# Altium footprint library Relays.PcbLib: 113 footprints (part 3 of 8)
Each footprint in its own frame and in the unit in brackets; x right, y up, seen from the top. Pads: shape width x height; smd on the part's side, far side on the other; paste and mask are expansions set on the pad; w line width, h text height; cw(c..) or ccw(c..) is an arc to the next point about the centre after c.
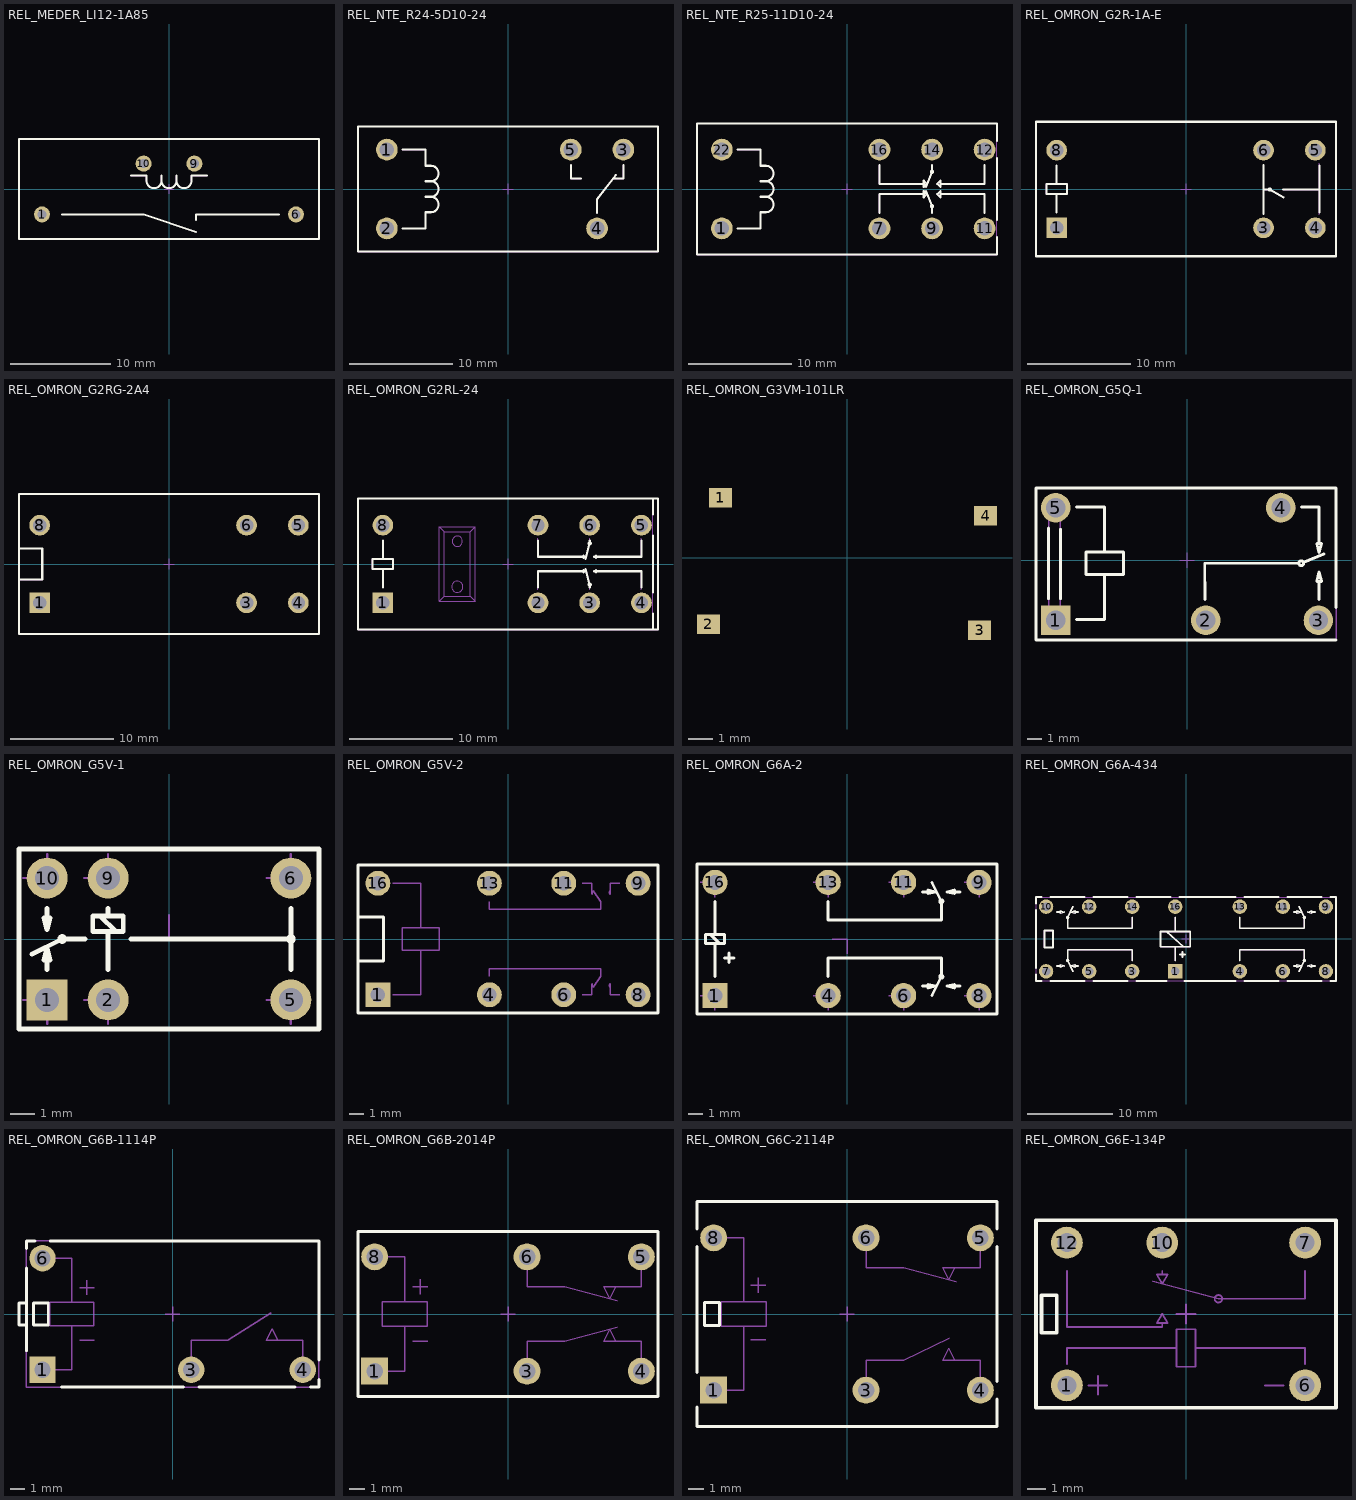
[diagram p2: the footprints below, top view; thin cyan lines are the x and y axes]

## REL_MEDER_LI12-1A85 [mm] "1 Form A, High Voltage, High Dielectric Strength, High Insulation Resistance, MEDER LI Series, Body 30 x 10 x 10.4mm"
height 10.4
pads (4):
  round 1.6 hole 0.9: 1(-12.7,-2.54) 6(12.7,-2.54) 9(2.54,2.54) 10(-2.54,2.54)
Top Overlay:
  lines w0.2: -10.7,-2.54 -2.5,-2.54 2.7,-4.28 ; -3.81,1.328 -2.25,1.328 -2.25,0.828 ccw(c-1.5,0.828) -0.75,0.828 ; -0.75,1.328 -0.75,0.828 ; 0.75,1.328 0.75,0.828 ; 2.696,-3.08 2.696,-2.54 11,-2.54 ; 3.81,1.328 2.25,1.328 2.25,0.828 cw(c1.5,0.828) 0.75,0.828 ; -0.75,0.828 ccw(c0,0.828) 0.75,0.828 ; -15,-5 -15,5 15,5 15,-5 -15,-5
Mechanical 8:
  lines w0.05: -13.2,-2.54 -12.7,-2.54 ; -12.7,-3.04 -12.7,-2.54 ; -12.7,-2.04 -12.7,-2.54 ; -12.2,-2.54 -12.7,-2.54 ; -3.04,2.54 -2.54,2.54 ; -2.54,2.04 -2.54,2.54 ; -2.54,3.04 -2.54,2.54 ; -2.04,2.54 -2.54,2.54 ; -0.5,0 0,0 ; 0,-0.5 0,0 ; 0,0.5 0,0 ; 0.5,0 0,0 ; 2.04,2.54 2.54,2.54 ; 2.54,2.04 2.54,2.54 ; 2.54,3.04 2.54,2.54 ; 3.04,2.54 2.54,2.54 ; 12.2,-2.54 12.7,-2.54 ; 12.7,-3.04 12.7,-2.54 ; 12.7,-2.04 12.7,-2.54 ; 13.2,-2.54 12.7,-2.54
Mechanical 14:
  lines w0.1: -10.7,-2.54 -2.5,-2.54 2.7,-4.28 ; -3.81,1.328 -2.25,1.328 -2.25,0.828 ccw(c-1.5,0.828) -0.75,0.828 ; -0.75,1.328 -0.75,0.828 ; 0.75,1.328 0.75,0.828 ; 2.696,-3.08 2.696,-2.54 11,-2.54 ; 3.81,1.328 2.25,1.328 2.25,0.828 cw(c1.5,0.828) 0.75,0.828 ; -0.75,0.828 ccw(c0,0.828) 0.75,0.828 ; -15,-5 -15,5 15,5 15,-5 -15,-5
3D body "REL_MEDER_LI12-1A85.stp": height 10.4, standoff -3, extent -15,-5 15,5

## REL_NTE_R24-5D10-24 [mm] "SPDT PCB Relay, R24 Series"
height 26.2
pads (5):
  round 2.1 hole 1.4: 1(-11.71,3.81) 2(-11.71,-3.81) 3(11.15,3.81) 4(8.61,-3.81) 5(6.07,3.81)
Top Overlay:
  lines w0.2: -10.21,-3.81 -7.958,-3.81 -7.958,-2.25 -7.458,-2.25 ccw(c-7.458,-1.5) -7.458,-0.75 ; -10.21,3.81 -7.958,3.81 -7.958,2.25 -7.458,2.25 cw(c-7.458,1.5) -7.458,0.75 ; -7.958,-0.75 -7.458,-0.75 ; -7.958,0.75 -7.458,0.75 ; 6.07,2.31 6.07,1 7.07,1 ; 8.61,-2.31 8.61,-1 10.413,1.342 ; 10.15,1 11.15,1 11.15,2.31 ; -7.458,-0.75 ccw(c-7.458,0) -7.458,0.75 ; -14.5,-6.05 -14.5,6.05 14.5,6.05 14.5,-6.05 -14.5,-6.05
Mechanical 8:
  lines w0.1: -12.21,-3.81 -11.71,-3.81 ; -12.21,3.81 -11.71,3.81 ; -11.71,-4.31 -11.71,-3.81 ; -11.71,-3.31 -11.71,-3.81 ; -11.71,3.31 -11.71,3.81 ; -11.71,4.31 -11.71,3.81 ; -11.21,-3.81 -11.71,-3.81 ; -11.21,3.81 -11.71,3.81 ; -0.5,0 0,0 ; 0,-0.5 0,0 ; 0,0.5 0,0 ; 0.5,0 0,0 ; 5.57,3.81 6.07,3.81 ; 6.07,3.31 6.07,3.81 ; 6.07,4.31 6.07,3.81 ; 6.57,3.81 6.07,3.81 ; 8.11,-3.81 8.61,-3.81 ; 8.61,-4.31 8.61,-3.81 ; 8.61,-3.31 8.61,-3.81 ; 9.11,-3.81 8.61,-3.81 ; 10.65,3.81 11.15,3.81 ; 11.15,3.31 11.15,3.81 ; 11.15,4.31 11.15,3.81 ; 11.65,3.81 11.15,3.81
Mechanical 14:
  lines w0.1: -10.21,-3.81 -7.958,-3.81 -7.958,-2.25 -7.458,-2.25 ccw(c-7.458,-1.5) -7.458,-0.75 ; -10.21,3.81 -7.958,3.81 -7.958,2.25 -7.458,2.25 cw(c-7.458,1.5) -7.458,0.75 ; -7.958,-0.75 -7.458,-0.75 ; -7.958,0.75 -7.458,0.75 ; 6.07,2.31 6.07,1 7.07,1 ; 8.61,-2.31 8.61,-1 10.413,1.342 ; 10.15,1 11.15,1 11.15,2.31 ; -7.458,-0.75 ccw(c-7.458,0) -7.458,0.75 ; -14.5,-6.05 -14.5,6.05 14.5,6.05 14.5,-6.05 -14.5,-6.05
3D body "REL_NTE_R24-5D10-24.stp": height 26.2, standoff -3.8, extent -14.5,-6.05 14.5,6.05

## REL_NTE_R25-11D10-24 [mm] "DPDT PCB Relay, R25 Series"
height 25.5
pads (8):
  round 2.1 hole 1.4: 1(-12.1,-3.81) 7(3.14,-3.81) 9(8.22,-3.81) 11(13.3,-3.81) 12(13.3,3.81) 14(8.22,3.81) 16(3.14,3.81) 22(-12.1,3.81)
Top Overlay:
  circle w0.2: c8.22,-1.655 r0.1
  circle w0.2: c8.22,1.655 r0.1
  lines w0.2: -10.6,-3.81 -8.348,-3.81 -8.348,-2.25 -7.848,-2.25 ccw(c-7.848,-1.5) -7.848,-0.75 ; -10.6,3.81 -8.348,3.81 -8.348,2.25 -7.848,2.25 cw(c-7.848,1.5) -7.848,0.75 ; -8.348,-0.75 -7.848,-0.75 ; -8.348,0.75 -7.848,0.75 ; 3.14,-2.31 3.14,-0.5 7.42,-0.5 ; 3.14,2.31 3.14,0.5 7.42,0.5 ; 7.633,-0.2 8.22,-1.655 8.22,-2.31 ; 7.633,0.2 8.22,1.655 8.22,2.31 ; 9.02,-0.5 13.3,-0.5 13.3,-2.31 ; 9.02,0.5 13.3,0.5 13.3,2.31 ; 14.5,-4.65 14.5,-6.35 -14.5,-6.35 -14.5,6.35 14.5,6.35 14.5,4.65 ; 14.5,-3 14.5,3 ; -7.848,-0.75 ccw(c-7.848,0) -7.848,0.75 ; 7.42,-0.8 7.42,-0.2 7.72,-0.5 7.42,-0.8 ; 7.42,0.2 7.42,0.8 7.72,0.5 7.42,0.2 ; 8.72,-0.5 9.02,-0.2 9.02,-0.8 8.72,-0.5 ; 8.72,0.5 9.02,0.2 9.02,0.8 8.72,0.5
Mechanical 8:
  lines w0.1: -12.6,-3.81 -12.1,-3.81 ; -12.6,3.81 -12.1,3.81 ; -12.1,-4.31 -12.1,-3.81 ; -12.1,-3.31 -12.1,-3.81 ; -12.1,3.31 -12.1,3.81 ; -12.1,4.31 -12.1,3.81 ; -11.6,-3.81 -12.1,-3.81 ; -11.6,3.81 -12.1,3.81 ; -0.5,0 0,0 ; 0,-0.5 0,0 ; 0,0.5 0,0 ; 0.5,0 0,0 ; 2.64,3.81 3.14,3.81 ; 3.14,3.31 3.14,3.81 ; 3.14,4.31 3.14,3.81 ; 3.64,3.81 3.14,3.81 ; 7.72,3.81 8.22,3.81 ; 8.22,3.31 8.22,3.81 ; 8.22,4.31 8.22,3.81 ; 8.72,3.81 8.22,3.81 ; 12.8,-3.81 13.3,-3.81 ; 12.8,3.81 13.3,3.81 ; 13.3,-4.31 13.3,-3.81 ; 13.3,-3.31 13.3,-3.81 ; 13.3,3.31 13.3,3.81 ; 13.3,4.31 13.3,3.81 ; 13.8,-3.81 13.3,-3.81 ; 13.8,3.81 13.3,3.81 ; 2.64,-3.81 3.14,-3.81 ; 2.64,-3.81 3.14,-3.81 ; 2.64,-3.81 3.14,-3.81 ; 3.14,-4.31 3.14,-3.81 ; 3.14,-4.31 3.14,-3.81 ; 3.14,-4.31 3.14,-3.81 ; 3.14,-3.81 3.64,-3.81 ; 3.14,-3.81 3.14,-3.31 ; 3.14,-3.81 3.64,-3.81 ; 3.14,-3.81 3.14,-3.31 ; 3.14,-3.81 3.64,-3.81 ; 3.14,-3.81 3.14,-3.31 ; 7.72,-3.81 8.22,-3.81 ; 7.72,-3.81 8.22,-3.81 ; 7.72,-3.81 8.22,-3.81 ; 7.72,-3.81 8.22,-3.81 ; 8.22,-4.31 8.22,-3.81 ; 8.22,-4.31 8.22,-3.81 ; 8.22,-4.31 8.22,-3.81 ; 8.22,-4.31 8.22,-3.81 ; 8.22,-3.81 8.72,-3.81 ; 8.22,-3.81 8.22,-3.31 ; 8.22,-3.81 8.72,-3.81 ; 8.22,-3.81 8.22,-3.31 ; 8.22,-3.81 8.72,-3.81 ; 8.22,-3.81 8.22,-3.31 ; 8.22,-3.81 8.72,-3.81 ; 8.22,-3.81 8.22,-3.31
Mechanical 14:
  circle w0.1: c8.22,-1.655 r0.1
  circle w0.1: c8.22,1.655 r0.1
  lines w0.1: -10.6,-3.81 -8.348,-3.81 -8.348,-2.25 -7.848,-2.25 ccw(c-7.848,-1.5) -7.848,-0.75 ; -10.6,3.81 -8.348,3.81 -8.348,2.25 -7.848,2.25 cw(c-7.848,1.5) -7.848,0.75 ; -8.348,-0.75 -7.848,-0.75 ; -8.348,0.75 -7.848,0.75 ; 3.14,-2.31 3.14,-0.5 7.42,-0.5 ; 3.14,2.31 3.14,0.5 7.42,0.5 ; 7.633,-0.2 8.22,-1.655 8.22,-2.31 ; 7.633,0.2 8.22,1.655 8.22,2.31 ; 9.02,-0.5 13.3,-0.5 13.3,-2.31 ; 9.02,0.5 13.3,0.5 13.3,2.31 ; -7.848,-0.75 ccw(c-7.848,0) -7.848,0.75 ; -14.5,-6.35 14.5,-6.35 14.5,6.35 -14.5,6.35 -14.5,-6.35 ; 7.42,-0.8 7.42,-0.2 7.72,-0.5 7.42,-0.8 ; 7.42,0.2 7.42,0.8 7.72,0.5 7.42,0.2 ; 8.72,-0.5 9.02,-0.2 9.02,-0.8 8.72,-0.5 ; 8.72,0.5 9.02,0.2 9.02,0.8 8.72,0.5
3D body "REL_NTE_R25-11D10-24.stp": height 25.5, standoff -3.8, extent -14.5,-6.35 14.5,6.35

## REL_OMRON_G2R-1A-E [mm] "6 Leads, Row Spacing 7.5 mm; Body 29mm x 13mm, OMRON_G2R-1A-E Series"
height 25.5
pads (6):
  rect 2x2 hole 1.3: 1(-12.5,-3.75)
  round 2 hole 1.3: 3(7.5,-3.75) 4(12.5,-3.75) 5(12.5,3.75) 6(7.5,3.75) 8(-12.5,3.75)
Top Overlay:
  circle w0.2: c8.1,-0.05 r0.1
  lines w0.2: -12.5,-2.25 -12.5,-0.5 ; -12.5,0.5 -12.5,2.25 ; 7.5,-2.4 7.5,2.3 ; 7.5,-0.05 8.1,-0.05 9.444,-0.828 ; 9.4,-0.05 12.8,-0.05 ; 12.9,-2.25 12.9,2.25 ; -14.5,-6.5 14.5,-6.5 14.5,6.5 -14.5,6.5 -14.5,-6.5 ; -13.5,-0.5 -11.5,-0.5 -11.5,0.5 -13.5,0.5 -13.5,-0.5
Mechanical 8:
  lines w0.05: -13,-3.75 -12.5,-3.75 ; -13,3.75 -12.5,3.75 ; -12.5,-4.25 -12.5,-3.75 ; -12.5,-3.25 -12.5,-3.75 ; -12.5,3.25 -12.5,3.75 ; -12.5,4.25 -12.5,3.75 ; -12,-3.75 -12.5,-3.75 ; -12,3.75 -12.5,3.75 ; -0.5,0 0,0 ; 0,-0.5 0,0 ; 0,0.5 0,0 ; 0.5,0 0,0 ; 7,-3.75 7.5,-3.75 ; 7,3.75 7.5,3.75 ; 7.5,-4.25 7.5,-3.75 ; 7.5,-3.25 7.5,-3.75 ; 7.5,3.25 7.5,3.75 ; 7.5,4.25 7.5,3.75 ; 8,-3.75 7.5,-3.75 ; 8,3.75 7.5,3.75 ; 12,-3.75 12.5,-3.75 ; 12,3.75 12.5,3.75 ; 12.5,-4.25 12.5,-3.75 ; 12.5,-3.25 12.5,-3.75 ; 12.5,3.25 12.5,3.75 ; 12.5,4.25 12.5,3.75 ; 13,-3.75 12.5,-3.75 ; 13,3.75 12.5,3.75
Mechanical 14:
  lines w0.1: -12.5,-2.25 -12.5,-0.5 ; -12.5,0.5 -12.5,2.25 ; 7.5,-2.4 7.5,2.3 ; 7.5,-0.05 8.1,-0.05 9.444,-0.828 ; 9.4,-0.05 12.8,-0.05 ; 12.9,-2.5 12.9,2.5 ; -14.5,-6.5 14.5,-6.5 14.5,6.5 -14.5,6.5 -14.5,-6.5 ; -13.5,-0.5 -11.5,-0.5 -11.5,0.5 -13.5,0.5 -13.5,-0.5
3D body "REL_OMRON_G2R-1A-E.stp": height 25.5, standoff -4, extent -14.5,-6.5 14.5,6.5

## REL_OMRON_G2RG-2A4 [mm] "6 Leads, Row Spacing 7.5 mm; Body 29mm x 13.5mm, OMRON_G2RG Series"
height 25.5
pads (6):
  rect 2x2 hole 1.3: 1(-12.5,-3.75)
  round 2 hole 1.3: 3(7.5,-3.75) 4(12.5,-3.75) 5(12.5,3.75) 6(7.5,3.75) 8(-12.5,3.75)
Top Overlay:
  lines w0.2: -14.5,-1.5 -12.25,-1.5 -12.25,1.5 -14.5,1.5 ; -14.5,-6.75 14.5,-6.75 14.5,6.75 -14.5,6.75 -14.5,-6.75
Mechanical 8:
  lines w0.1: -13,-3.75 -12.5,-3.75 ; -13,3.75 -12.5,3.75 ; -12.5,-4.25 -12.5,-3.75 ; -12.5,-3.25 -12.5,-3.75 ; -12.5,3.25 -12.5,3.75 ; -12.5,4.25 -12.5,3.75 ; -12,-3.75 -12.5,-3.75 ; -12,3.75 -12.5,3.75 ; -0.5,0 0,0 ; 0,-0.5 0,0 ; 0,0.5 0,0 ; 0.5,0 0,0 ; 7,-3.75 7.5,-3.75 ; 7,3.75 7.5,3.75 ; 7.5,-4.25 7.5,-3.75 ; 7.5,-3.25 7.5,-3.75 ; 7.5,3.25 7.5,3.75 ; 7.5,4.25 7.5,3.75 ; 8,-3.75 7.5,-3.75 ; 8,3.75 7.5,3.75 ; 12,-3.75 12.5,-3.75 ; 12,3.75 12.5,3.75 ; 12.5,-4.25 12.5,-3.75 ; 12.5,-3.25 12.5,-3.75 ; 12.5,3.25 12.5,3.75 ; 12.5,4.25 12.5,3.75 ; 13,-3.75 12.5,-3.75 ; 13,3.75 12.5,3.75
Mechanical 14:
  lines w0.1: -14.5,-1.5 -12.25,-1.5 -12.25,1.5 -14.5,1.5 ; -14.5,-6.75 14.5,-6.75 14.5,6.75 -14.5,6.75 -14.5,-6.75
3D body "REL_OMRON_G2RG-2A4.stp": height 25.5, standoff -3.6, extent -14.5,-6.75 14.5,6.75

## REL_OMRON_G2RL-24 [mm] "8 Leads, Row Spacing 7.5 mm; Body 29mm x 12.7mm, OMRON_G2RL Series"
height 15.7
pads (8):
  rect 2x2 hole 1.3: 1(-12.1,-3.75)
  round 2 hole 1.3: 2(2.9,-3.75) 3(7.9,-3.75) 4(12.9,-3.75) 5(12.9,3.75) 6(7.9,3.75) 7(2.9,3.75) 8(-12.1,3.75)
Top Overlay:
  circle w0.2: c7.9,-2 r0.1
  circle w0.2: c7.9,2 r0.1
  lines w0.2: -12.1,-2.25 -12.1,-0.5 ; -12.1,0.5 -12.1,2.25 ; 2.9,-2.25 2.9,-0.7 7.3,-0.7 ; 2.9,2.25 2.9,0.7 7.3,0.7 ; 7.5,-0.5 7.9,-2 7.9,-2.25 ; 7.5,0.5 7.9,2 7.9,2.25 ; 8.5,-0.7 12.9,-0.7 12.9,-2.25 ; 8.5,0.7 12.9,0.7 12.9,2.25 ; 14,-6.35 14,-4.77 ; 14,-2.73 14,2.73 ; 14,4.77 14,6.35 ; -14.5,-6.35 14.5,-6.35 14.5,6.35 -14.5,6.35 -14.5,-6.35 ; -13.1,-0.5 -11.1,-0.5 -11.1,0.5 -13.1,0.5 -13.1,-0.5 ; 7.3,-0.8 7.3,-0.6 7.5,-0.7 7.3,-0.8 ; 7.3,0.6 7.3,0.8 7.5,0.7 7.3,0.6 ; 8.3,-0.7 8.5,-0.6 8.5,-0.8 8.3,-0.7 ; 8.3,0.7 8.5,0.6 8.5,0.8 8.3,0.7
Mechanical 8:
  lines w0.1: -12.6,-3.75 -12.1,-3.75 -12.1,-4.25 ; -12.6,3.75 -12.1,3.75 -12.1,3.25 ; -0.5,0 0,0 ; 0,-0.5 0,0 ; 0,0.5 0,0 ; 0.5,0 0,0 ; 2.4,-3.75 2.9,-3.75 2.9,-4.25 ; 2.4,3.75 2.9,3.75 2.9,3.25 ; 7.4,-3.75 7.9,-3.75 7.9,-4.25 ; 7.4,3.75 7.9,3.75 7.9,3.25 ; 12.4,-3.75 12.9,-3.75 12.9,-4.25 ; 12.4,3.75 12.9,3.75 12.9,3.25
Mechanical 14:
  circle w0.1: c-4.9,2.2 r0.5
  circle w0.1: c-4.9,-2.2 r0.54
  circle w0.1: c7.9,-2 r0.05
  circle w0.1: c7.9,2 r0.05
  lines w0.1: -12.1,-2.25 -12.1,-0.5 ; -12.1,0.5 -12.1,2.25 ; 2.9,-2.5 2.9,-0.7 7.3,-0.7 ; 2.9,2.5 2.9,0.7 7.3,0.7 ; 7.5,-0.5 7.9,-2 7.9,-2.5 ; 7.5,0.5 7.9,2 7.9,2.5 ; 8.5,-0.7 12.9,-0.7 12.9,-2.5 ; 8.5,0.7 12.9,0.7 12.9,2.5 ; 14,-6.35 14,6.35 ; -6.65,-3.6 -3.15,-3.6 ; -6.65,-3.6 -6.65,3.6 ; -6.65,-3.6 -6.15,-3.1 ; -6.65,3.6 -3.15,3.6 ; -6.65,3.6 -6.15,3.1 ; -6.15,-3.1 -3.65,-3.1 ; -6.15,-3.1 -6.15,3.1 ; -6.15,3.1 -3.65,3.1 ; -3.65,-3.1 -3.15,-3.6 ; -3.65,-3.1 -3.65,3.1 ; -3.65,3.1 -3.15,3.6 ; -3.15,-3.6 -3.15,3.6 ; -14.5,-6.35 14.5,-6.35 14.5,6.35 -14.5,6.35 -14.5,-6.35 ; -13.1,-0.5 -11.1,-0.5 -11.1,0.5 -13.1,0.5 -13.1,-0.5 ; 7.3,-0.8 7.3,-0.6 7.5,-0.7 7.3,-0.8 ; 7.3,0.6 7.3,0.8 7.5,0.7 7.3,0.6 ; 8.3,-0.7 8.5,-0.6 8.5,-0.8 8.3,-0.7 ; 8.3,0.7 8.5,0.6 8.5,0.8 8.3,0.7
3D body "REL_OMRON_G2RL-24.stp": height 15.7, standoff -3.5, extent -14.5,-6.35 14.5,6.35

## REL_OMRON_G3VM-101LR [mm] "SMD MOS FET Relay in SSOP Package, Body 3.8mm x 2.04mm"
height 1.8
pads (4):
  rect 0.95x0.8 smd: 1(-5.25,2.5) 2(-5.75,-2.75) 3(5.5,-3) 4(5.75,1.75)

## REL_OMRON_G5Q-1 [mm] "5 Leads, Row Spacing 7.62 mm; Body 20.3mm x 10.3mm OMRON_G5Q-1 Series"
height 15.8
pads (5):
  rect 2x2 hole 1.3: 1(-8.89,-4.06)
  round 2 hole 1.3: 2(1.27,-4.06) 3(8.89,-4.06) 4(6.35,3.56) 5(-8.89,3.56)
Top Overlay:
  circle w0.2: c7.725,-0.2 r0.159
  lines w0.2: -9.37,-2.6 -9.37,2.2 ; -8.57,-2.6 -8.57,2.1 ; -7.475,-4.01 -5.57,-4.01 -5.57,-0.962 ; -7.475,3.61 -5.57,3.61 -5.57,0.562 ; 1.22,-2.65 1.2,-0.2 7.566,-0.2 ; 7.76,3.61 8.94,3.61 8.94,1.15 ; 7.872,-0.139 9.265,0.435 ; 8.94,-2.663 8.94,-1.433 ; 10.08,-5.4 -10.22,-5.4 -10.22,4.9 10.08,4.9 10.08,-3.2 ; -6.84,-0.962 -6.84,0.562 -4.3,0.562 -4.3,-0.962 -6.84,-0.962 ; 8.781,-1.42 9.099,-1.42 8.94,-0.785 8.781,-1.42 ; 8.781,1.15 8.94,0.515 9.099,1.15 8.781,1.15
Mechanical 8:
  lines w0.05: -9.39,-4.06 -8.89,-4.06 ; -9.39,3.56 -8.89,3.56 ; -8.89,-4.56 -8.89,-4.06 ; -8.89,-3.56 -8.89,-4.06 ; -8.89,3.06 -8.89,3.56 ; -8.89,4.06 -8.89,3.56 ; -8.39,-4.06 -8.89,-4.06 ; -8.39,3.56 -8.89,3.56 ; -0.5,0 0,0 ; 0,-0.5 0,0 ; 0,0.5 0,0 ; 0.5,0 0,0 ; 0.77,-4.06 1.27,-4.06 ; 1.27,-4.56 1.27,-4.06 ; 1.27,-3.56 1.27,-4.06 ; 1.77,-4.06 1.27,-4.06 ; 5.35,3.56 6.35,3.56 ; 5.85,3.56 6.35,3.56 ; 6.35,2.56 6.35,3.56 ; 6.35,3.06 6.35,3.56 ; 6.35,4.06 6.35,3.56 ; 6.35,4.56 6.35,3.56 ; 6.85,3.56 6.35,3.56 ; 7.35,3.56 6.35,3.56 ; 8.39,-4.06 8.89,-4.06 ; 8.89,-4.56 8.89,-4.06 ; 8.89,-3.56 8.89,-4.06 ; 9.39,-4.06 8.89,-4.06
Mechanical 14:
  lines w0.1: -7.475,-4.01 -5.57,-4.01 -5.57,-0.962 ; -7.475,3.61 -5.57,3.61 -5.57,0.562 ; -10.22,-5.4 10.08,-5.4 10.08,4.9 -10.22,4.9 -10.22,-5.4 ; -9.37,-3.75 -9.37,3.25 -8.57,3.25 -8.57,-3.75 -9.37,-3.75 ; -6.84,-0.962 -6.84,0.562 -4.3,0.562 -4.3,-0.962 -6.84,-0.962
3D body "REL_OMRON_G5Q-1.stp": height 16.2, standoff -3.4, extent -10.22,-5.4 10.08,4.9

## REL_OMRON_G5V-1 [mm] "6 Leads, Row Spacing 5.08mm; Body 12.5mm x 7.5mm, OMRON_G5V-1 Series"
height 10
pads (6):
  rect 1.7x1.7 hole 1: 1(-5.08,-2.54)
  round 1.7 hole 1: 2(-2.54,-2.54) 5(5.08,-2.54) 6(5.08,2.54) 9(-2.54,2.54) 10(-5.08,2.54)
Top Overlay:
  circle w0.2: c-4.445,0 r0.1
  circle w0.2: c5.08,0 r0.1
  lines w0.2: -5.715,-0.635 -4.445,0 -3.492,0 ; -5.08,-1.27 -5.08,-0.885 ; -5.08,0.885 -5.08,1.27 ; -2.858,0.953 -2.222,0.318 ; -2.54,-1.27 -2.54,0.318 ; -2.54,0.953 -2.54,1.27 ; -1.587,0 5.08,0 ; 5.08,-1.27 5.08,1.27 ; -6.25,-3.75 6.25,-3.75 6.25,3.75 -6.25,3.75 -6.25,-3.75 ; -5.205,-0.885 -4.955,-0.885 -5.08,-0.385 -5.205,-0.885 ; -5.205,0.885 -4.955,0.885 -5.08,0.385 -5.205,0.885 ; -3.175,0.318 -3.175,0.953 -1.905,0.953 -1.905,0.318 -3.175,0.318
Mechanical 8:
  lines w0.1: -6.08,-2.54 -5.08,-2.54 -5.08,-3.54 ; -6.08,2.54 -5.08,2.54 -5.08,3.54 ; -3.54,-2.54 -2.54,-2.54 -2.54,-3.54 ; -3.54,2.54 -2.54,2.54 -2.54,3.54 ; -1,0 0,0 0,1 ; 4.08,-2.54 5.08,-2.54 5.08,-3.54 ; 4.08,2.54 5.08,2.54 5.08,3.54
Mechanical 14:
  circle w0.1: c5.08,0 r0.1
  circle w0.1: c-4.445,0 r0.1
  lines w0.1: -5.715,-0.635 -4.445,0 -3.492,0 ; -5.08,-1.27 -5.08,-0.885 ; -5.08,0.885 -5.08,1.27 ; -2.858,0.953 -2.222,0.318 ; -2.54,-1.27 -2.54,0.318 ; -2.54,0.953 -2.54,1.27 ; -1.587,0 5.08,0 ; 5.08,-1.27 5.08,1.27 ; -6.25,-3.75 -6.25,3.75 6.25,3.75 6.25,-3.75 -6.25,-3.75 ; -5.205,-0.885 -5.08,-0.385 -4.955,-0.885 -5.205,-0.885 ; -5.205,0.885 -5.08,0.385 -4.955,0.885 -5.205,0.885 ; -3.175,0.318 -1.905,0.318 -1.905,0.953 -3.175,0.953 -3.175,0.318
3D body "REL_OMRON_G5V-1.stp": height 10, standoff -3.5, extent -6.25,-3.75 6.25,3.75

## REL_OMRON_G5V-2 [mm] "8 Leads, Row Spacing 7.62 mm; Body 20.5mm x 10.1mm, OMRON_G5V-2 Series"
height 11.5
pads (8):
  rect 1.7x1.7 hole 1: 1(-8.89,-3.81)
  round 1.7 hole 1: 4(-1.27,-3.81) 6(3.81,-3.81) 8(8.89,-3.81) 9(8.89,3.81) 11(3.81,3.81) 13(-1.27,3.81) 16(-8.89,3.81)
Top Overlay:
  lines w0.2: -10.25,-1.5 -8.5,-1.5 -8.5,1.5 -10.25,1.5 ; -10.25,-5.05 10.25,-5.05 10.25,5.05 -10.25,5.05 -10.25,-5.05
Mechanical 14:
  lines w0.1: -10.25,-1.5 -8.5,-1.5 -8.5,1.5 -10.25,1.5 ; -7.874,-3.81 -5.969,-3.81 -5.969,-0.762 ; -7.874,3.81 -5.969,3.81 -5.969,0.762 ; -1.27,-2.54 -1.27,-2.032 6.35,-2.032 6.35,-2.54 5.842,-3.302 ; -1.27,2.54 -1.27,2.032 6.35,2.032 6.35,2.54 5.842,3.302 ; 5.08,-3.81 5.715,-3.81 5.715,-3.048 cw(c5.588,-3.175) 5.715,-3.302 ; 5.08,3.81 5.715,3.81 5.715,3.048 ccw(c5.588,3.175) 5.715,3.302 ; 6.985,-3.302 cw(c7.112,-3.175) 6.985,-3.048 6.985,-3.81 7.62,-3.81 ; 6.985,3.302 ccw(c7.112,3.175) 6.985,3.048 6.985,3.81 7.62,3.81 ; -10.25,-5.05 10.25,-5.05 10.25,5.05 -10.25,5.05 -10.25,-5.05 ; -7.239,-0.762 -4.699,-0.762 -4.699,0.762 -7.239,0.762 -7.239,-0.762
3D body "REL_OMRON_G5V-2.stp": height 11.5, standoff -3.5, extent -10.249,-5.049 10.251,5.051

## REL_OMRON_G6A-2 [mm] "10 Leads, Row Spacing 7.62mm; Body 20.2mm x 10.1mm, OMRON_G6A-2 Series"
height 8.4
pads (8):
  rect 1.7x1.7 hole 1: 1(-8.89,-3.81)
  round 1.7 hole 1: 4(-1.27,-3.81) 6(3.81,-3.81) 8(8.89,-3.81) 9(8.89,3.81) 11(3.81,3.81) 13(-1.27,3.81) 16(-8.89,3.81)
Top Overlay:
  circle w0.2: c6.35,-2.54 r0.1
  circle w0.2: c6.35,2.54 r0.1
  lines w0.2: -9.207,0.318 -8.572,-0.317 ; -8.89,-2.54 -8.89,-0.317 ; -8.89,0.318 -8.89,2.54 ; -8.255,-1.27 -7.62,-1.27 ; -7.938,-1.587 -7.938,-0.952 ; -1.27,-2.54 -1.27,-1.27 6.35,-1.27 6.35,-2.54 5.715,-3.81 ; -1.27,2.54 -1.27,1.27 6.35,1.27 6.35,2.54 5.715,3.81 ; 5.08,-3.175 5.465,-3.175 ; 5.08,3.175 5.465,3.175 ; 7.235,-3.175 7.62,-3.175 ; 7.235,3.175 7.62,3.175 ; -10.1,-5.05 10.1,-5.05 10.1,5.05 -10.1,5.05 -10.1,-5.05 ; -9.525,-0.317 -9.525,0.318 -8.255,0.318 -8.255,-0.317 -9.525,-0.317 ; 5.465,-3.3 5.465,-3.05 5.965,-3.175 5.465,-3.3 ; 5.465,3.05 5.965,3.175 5.465,3.3 5.465,3.05 ; 6.735,-3.175 7.235,-3.05 7.235,-3.3 6.735,-3.175 ; 6.735,3.175 7.235,3.05 7.235,3.3 6.735,3.175
Mechanical 8:
  lines w0.1: -9.89,-3.81 -8.89,-3.81 -8.89,-4.81 ; -9.89,3.81 -8.89,3.81 -8.89,2.81 ; -2.27,-3.81 -1.27,-3.81 -1.27,-4.81 ; -2.27,3.81 -1.27,3.81 -1.27,2.81 ; -1,0 0,0 0,-1 ; 2.81,-3.81 3.81,-3.81 3.81,-4.81 ; 2.81,3.81 3.81,3.81 3.81,2.81 ; 7.89,-3.81 8.89,-3.81 8.89,-4.81 ; 7.89,3.81 8.89,3.81 8.89,2.81 ; -9.19,-3.96 -8.59,-3.96 -8.59,-3.66 -9.19,-3.66 -9.19,-3.96 ; -9.19,3.66 -8.59,3.66 -8.59,3.96 -9.19,3.96 -9.19,3.66 ; -1.57,-3.96 -0.97,-3.96 -0.97,-3.66 -1.57,-3.66 -1.57,-3.96 ; -1.57,3.66 -0.97,3.66 -0.97,3.96 -1.57,3.96 -1.57,3.66 ; 3.51,-3.96 4.11,-3.96 4.11,-3.66 3.51,-3.66 3.51,-3.96 ; 3.51,3.66 4.11,3.66 4.11,3.96 3.51,3.96 3.51,3.66 ; 8.59,-3.96 9.19,-3.96 9.19,-3.66 8.59,-3.66 8.59,-3.96 ; 8.59,3.66 9.19,3.66 9.19,3.96 8.59,3.96 8.59,3.66
Mechanical 14:
  circle w0.1: c6.35,-2.54 r0.1
  circle w0.1: c6.35,2.54 r0.1
  lines w0.1: -9.207,0.318 -8.572,-0.317 ; -8.89,-2.54 -8.89,-0.317 ; -8.89,0.318 -8.89,2.54 ; -8.255,-1.27 -7.62,-1.27 ; -7.938,-1.587 -7.938,-0.952 ; -1.27,-2.54 -1.27,-1.27 6.35,-1.27 6.35,-2.54 5.715,-3.81 ; -1.27,2.54 -1.27,1.27 6.35,1.27 6.35,2.54 5.715,3.81 ; 5.08,-3.175 5.465,-3.175 ; 5.08,3.175 5.465,3.175 ; 7.235,-3.175 7.62,-3.175 ; 7.235,3.175 7.62,3.175 ; -10.1,-5.05 -10.1,5.05 10.1,5.05 10.1,-5.05 -10.1,-5.05 ; -9.525,-0.317 -9.525,0.318 -8.255,0.318 -8.255,-0.317 -9.525,-0.317 ; 5.465,-3.3 5.965,-3.175 5.465,-3.05 5.465,-3.3 ; 5.465,3.05 5.465,3.3 5.965,3.175 5.465,3.05 ; 6.735,-3.175 7.235,-3.3 7.235,-3.05 6.735,-3.175 ; 6.735,3.175 7.235,3.3 7.235,3.05 6.735,3.175
3D body "REL_OMRON_G6A-2.stp": height 8.4, standoff -3.16, extent -10.1,-5.05 10.1,5.05

## REL_OMRON_G6A-434 [mm] "14 Leads, Row Spacing 7.62mm; Body 35.4mm x 10.1mm, OMRON G6A-434 Case"
height 8.4
pads (14):
  rect 1.7x1.7 hole 1: 1(-1.27,-3.81)
  round 1.7 hole 1: 3(-6.35,-3.81) 4(6.35,-3.81) 5(-11.43,-3.81) 6(11.43,-3.81) 7(-16.51,-3.81) 8(16.51,-3.81) 9(16.51,3.81) 10(-16.51,3.81) 11(11.43,3.81) 12(-11.43,3.81) 13(6.35,3.81) 14(-6.35,3.81) 16(-1.27,3.81)
Top Overlay:
  circle w0.2: c13.97,-2.54 r0.1
  circle w0.2: c13.97,2.54 r0.1
  circle w0.2: c-13.97,-2.54 r0.1
  circle w0.2: c-13.97,2.54 r0.1
  lines w0.2: -17.7,-4.193 -17.7,-4.95 -17.023,-4.95 ; -17.7,-3.427 -17.7,3.427 ; -17.7,4.193 -17.7,4.95 -17.023,4.95 ; -15.997,-4.95 -11.943,-4.95 ; -15.997,4.95 -11.943,4.95 ; -15.24,-3.175 -14.855,-3.175 ; -15.24,3.175 -14.855,3.175 ; -13.335,-3.81 -13.97,-2.54 -13.97,-1.27 -6.35,-1.27 -6.35,-2.54 ; -13.335,3.81 -13.97,2.54 -13.97,1.27 -6.35,1.27 -6.35,2.54 ; -13.085,-3.175 -12.7,-3.175 ; -13.085,3.175 -12.7,3.175 ; -10.917,-4.95 -6.863,-4.95 ; -10.917,4.95 -6.863,4.95 ; -5.837,-4.95 -2.3,-4.95 ; -5.837,4.95 -1.783,4.95 ; -2.275,0.875 -0.289,-0.916 ; -1.27,-2.54 -1.27,-0.9 ; -1.27,0.875 -1.27,2.54 ; -0.757,4.95 5.837,4.95 ; -0.735,-1.82 -0.1,-1.82 ; -0.417,-2.137 -0.417,-1.502 ; -0.2,-4.95 5.837,-4.95 ; 6.35,-2.54 6.35,-1.27 13.97,-1.27 13.97,-2.54 13.335,-3.81 ; 6.35,2.54 6.35,1.27 13.97,1.27 13.97,2.54 13.335,3.81 ; 6.863,-4.95 10.917,-4.95 ; 6.863,4.95 10.917,4.95 ; 11.943,-4.95 15.997,-4.95 ; 11.943,4.95 15.997,4.95 ; 12.7,-3.175 13.085,-3.175 ; 12.7,3.175 13.085,3.175 ; 14.855,-3.175 15.24,-3.175 ; 14.855,3.175 15.24,3.175 ; 17.023,-4.95 17.7,-4.95 17.7,4.95 17.023,4.95 ; -16.7,-1 -15.7,-1 ; -16.7,-1 -16.7,1 ; -16.7,-1 -16.7,1 ; -16.7,-1 -15.7,-1 ; -16.7,1 -15.7,1 ; -16.7,1 -15.7,1 ; -15.7,-1 -15.7,1 ; -15.7,-1 -15.7,1 ; -14.855,-3.3 -14.855,-3.05 -14.355,-3.175 -14.855,-3.3 ; -14.855,3.05 -14.355,3.175 -14.855,3.3 -14.855,3.05 ; -13.585,-3.175 -13.085,-3.05 -13.085,-3.3 -13.585,-3.175 ; -13.585,3.175 -13.085,3.05 -13.085,3.3 -13.585,3.175 ; -3,-0.9 -3,0.875 0.5,0.875 0.5,-0.9 -3,-0.9 ; 13.085,-3.3 13.085,-3.05 13.585,-3.175 13.085,-3.3 ; 13.085,3.05 13.585,3.175 13.085,3.3 13.085,3.05 ; 14.355,-3.175 14.855,-3.05 14.855,-3.3 14.355,-3.175 ; 14.355,3.175 14.855,3.05 14.855,3.3 14.355,3.175
Mechanical 8:
  lines w0.1: -17.01,-3.81 -16.51,-3.81 ; -17.01,3.81 -16.51,3.81 ; -16.51,-4.31 -16.51,-3.81 ; -16.51,-3.31 -16.51,-3.81 ; -16.51,3.31 -16.51,3.81 ; -16.51,4.31 -16.51,3.81 ; -16.01,-3.81 -16.51,-3.81 ; -16.01,3.81 -16.51,3.81 ; -11.93,-3.81 -11.43,-3.81 ; -11.93,3.81 -11.43,3.81 ; -11.43,-4.31 -11.43,-3.81 ; -11.43,-3.31 -11.43,-3.81 ; -11.43,3.31 -11.43,3.81 ; -11.43,4.31 -11.43,3.81 ; -10.93,-3.81 -11.43,-3.81 ; -10.93,3.81 -11.43,3.81 ; -6.85,-3.81 -6.35,-3.81 ; -6.85,3.81 -6.35,3.81 ; -6.35,-4.31 -6.35,-3.81 ; -6.35,-3.31 -6.35,-3.81 ; -6.35,3.31 -6.35,3.81 ; -6.35,4.31 -6.35,3.81 ; -5.85,-3.81 -6.35,-3.81 ; -5.85,3.81 -6.35,3.81 ; -1.77,-3.81 -1.27,-3.81 ; -1.77,3.81 -1.27,3.81 ; -1.27,-4.31 -1.27,-3.81 ; -1.27,-3.31 -1.27,-3.81 ; -1.27,3.31 -1.27,3.81 ; -1.27,4.31 -1.27,3.81 ; -0.77,-3.81 -1.27,-3.81 ; -0.77,3.81 -1.27,3.81 ; -0.5,0 0,0 ; 0,-0.5 0,0 ; 0,0.5 0,0 ; 0.5,0 0,0 ; 5.85,-3.81 6.35,-3.81 ; 5.85,3.81 6.35,3.81 ; 6.35,-4.31 6.35,-3.81 ; 6.35,-3.31 6.35,-3.81 ; 6.35,3.31 6.35,3.81 ; 6.35,4.31 6.35,3.81 ; 6.85,-3.81 6.35,-3.81 ; 6.85,3.81 6.35,3.81 ; 10.93,-3.81 11.43,-3.81 ; 10.93,3.81 11.43,3.81 ; 11.43,-4.31 11.43,-3.81 ; 11.43,-3.31 11.43,-3.81 ; 11.43,3.31 11.43,3.81 ; 11.43,4.31 11.43,3.81 ; 11.93,-3.81 11.43,-3.81 ; 11.93,3.81 11.43,3.81 ; 16.01,-3.81 16.51,-3.81 ; 16.01,3.81 16.51,3.81 ; 16.51,-4.31 16.51,-3.81 ; 16.51,-3.31 16.51,-3.81 ; 16.51,3.31 16.51,3.81 ; 16.51,4.31 16.51,3.81 ; 17.01,-3.81 16.51,-3.81 ; 17.01,3.81 16.51,3.81
Mechanical 14:
  circle w0.1: c-13.97,2.54 r0.1
  circle w0.1: c-13.97,-2.54 r0.1
  circle w0.1: c13.97,2.54 r0.1
  circle w0.1: c13.97,-2.54 r0.1
  lines w0.1: -15.24,-3.175 -14.855,-3.175 ; -15.24,3.175 -14.855,3.175 ; -13.335,-3.81 -13.97,-2.54 -13.97,-1.27 -6.35,-1.27 -6.35,-2.54 ; -13.335,3.81 -13.97,2.54 -13.97,1.27 -6.35,1.27 -6.35,2.54 ; -13.085,-3.175 -12.7,-3.175 ; -13.085,3.175 -12.7,3.175 ; -2.275,0.875 -0.289,-0.916 ; -1.27,-2.54 -1.27,-0.9 ; -1.27,0.875 -1.27,2.54 ; -0.735,-1.82 -0.1,-1.82 ; -0.417,-2.137 -0.417,-1.502 ; 6.35,-2.54 6.35,-1.27 13.97,-1.27 13.97,-2.54 13.335,-3.81 ; 6.35,2.54 6.35,1.27 13.97,1.27 13.97,2.54 13.335,3.81 ; 12.7,-3.175 13.085,-3.175 ; 12.7,3.175 13.085,3.175 ; 14.855,-3.175 15.24,-3.175 ; 14.855,3.175 15.24,3.175 ; -17.7,-4.95 -17.7,4.95 17.7,4.95 17.7,-4.95 -17.7,-4.95 ; -16.7,-1 -16.7,1 -15.7,1 -15.7,-1 -16.7,-1 ; -14.855,-3.3 -14.355,-3.175 -14.855,-3.05 -14.855,-3.3 ; -14.855,3.05 -14.855,3.3 -14.355,3.175 -14.855,3.05 ; -13.585,-3.175 -13.085,-3.3 -13.085,-3.05 -13.585,-3.175 ; -13.585,3.175 -13.085,3.3 -13.085,3.05 -13.585,3.175 ; -3,-0.9 0.5,-0.9 0.5,0.875 -3,0.875 -3,-0.9 ; 13.085,-3.3 13.585,-3.175 13.085,-3.05 13.085,-3.3 ; 13.085,3.05 13.085,3.3 13.585,3.175 13.085,3.05 ; 14.355,-3.175 14.855,-3.3 14.855,-3.05 14.355,-3.175 ; 14.355,3.175 14.855,3.3 14.855,3.05 14.355,3.175
3D body "REL_OMRON_G6A-434.stp": height 8.2, standoff -2.52, extent -17.7,-4.95 17.7,4.95

## REL_OMRON_G6B-1114P [mm] "4 Leads, Row Spacing 7.62mm; Body 20mm x 10mm, OMRON_G6B-1114P Series"
height 10
pads (4):
  rect 1.8x1.8 hole 1.1: 1(-8.89,-3.81)
  round 1.8 hole 1.1: 3(1.27,-3.81) 4(8.89,-3.81) 6(-8.89,3.81)
Top Overlay:
  lines w0.2: -10,-2.51 -10,3.133 ; -10,4.487 -10,5 -9.413,5 ; -8.367,5 10,5 10,-3.133 ; -7.59,-5 0.747,-5 ; 1.793,-5 8.367,-5 ; 9.413,-5 10,-5 10,-4.487 ; -10.5,-0.75 -10.5,0.75 -10,0.75 -10,-0.75 -10.5,-0.75 ; -9.5,-0.75 -8.5,-0.75 -8.5,0.75 -9.5,0.75 -9.5,-0.75
Mechanical 8:
  lines w0.1: -9.39,-3.81 -8.89,-3.81 ; -9.39,3.81 -8.89,3.81 ; -8.89,-4.31 -8.89,-3.81 ; -8.89,-3.31 -8.89,-3.81 ; -8.89,3.31 -8.89,3.81 ; -8.89,4.31 -8.89,3.81 ; -8.39,-3.81 -8.89,-3.81 ; -8.39,3.81 -8.89,3.81 ; -0.5,0 0,0 ; 0,-0.5 0,0 ; 0,0.5 0,0 ; 0.5,0 0,0 ; 0.77,-3.81 1.27,-3.81 ; 1.27,-4.31 1.27,-3.81 ; 1.27,-3.31 1.27,-3.81 ; 1.77,-3.81 1.27,-3.81 ; 8.39,-3.81 8.89,-3.81 ; 8.89,-4.31 8.89,-3.81 ; 8.89,-3.31 8.89,-3.81 ; 9.39,-3.81 8.89,-3.81
Mechanical 14:
  lines w0.1: -8.89,-3.81 -6.89,-3.81 -6.89,-0.81 ; -8.89,3.81 -6.89,3.81 -6.89,0.81 ; -6.36,-1.81 -5.36,-1.81 ; -6.36,1.81 -5.36,1.81 ; -5.86,1.31 -5.86,2.31 ; 1.27,-3.81 1.27,-1.81 3.77,-1.81 6.725,0.075 ; 7.19,-1.81 6.79,-1.01 6.39,-1.81 8.89,-1.81 8.89,-3.81 ; -10,-5 10,-5 10,5 -10,5 -10,-5 ; -9.5,-0.75 -8.5,-0.75 -8.5,0.75 -9.5,0.75 -9.5,-0.75 ; -8.39,-0.81 -5.39,-0.81 -5.39,0.81 -8.39,0.81 -8.39,-0.81
3D body "REL_OMRON_G6B-1114P.stp": height 10, standoff -3.5, extent -10.5,-5 10,5

## REL_OMRON_G6B-2014P [mm] "6 Leads, Row Spacing 7.62mm; Body L 20mm x W 11mm x H 11mm, OMRON_G6B Series"
height 11
pads (6):
  rect 1.8x1.8 hole 1.1: 1(-8.89,-3.81)
  round 1.8 hole 1.1: 3(1.27,-3.81) 4(8.89,-3.81) 5(8.89,3.81) 6(1.27,3.81) 8(-8.89,3.81)
Top Overlay:
  lines w0.2: -10,-5.5 -10,5.5 10,5.5 10,-5.5 -10,-5.5
Mechanical 8:
  lines w0.1: -9.39,-3.81 -8.89,-3.81 ; -9.39,3.81 -8.89,3.81 ; -8.89,-4.31 -8.89,-3.81 ; -8.89,-3.31 -8.89,-3.81 ; -8.89,3.31 -8.89,3.81 ; -8.89,4.31 -8.89,3.81 ; -8.39,-3.81 -8.89,-3.81 ; -8.39,3.81 -8.89,3.81 ; -0.5,0 0,0 ; 0,-0.5 0,0 ; 0,0.5 0,0 ; 0.5,0 0,0 ; 0.77,-3.81 1.27,-3.81 ; 0.77,3.81 1.27,3.81 ; 1.27,-4.31 1.27,-3.81 ; 1.27,-3.31 1.27,-3.81 ; 1.27,3.31 1.27,3.81 ; 1.27,4.31 1.27,3.81 ; 1.77,-3.81 1.27,-3.81 ; 1.77,3.81 1.27,3.81 ; 8.39,-3.81 8.89,-3.81 ; 8.39,3.81 8.89,3.81 ; 8.89,-4.31 8.89,-3.81 ; 8.89,-3.31 8.89,-3.81 ; 8.89,3.31 8.89,3.81 ; 8.89,4.31 8.89,3.81 ; 9.39,-3.81 8.89,-3.81 ; 9.39,3.81 8.89,3.81
Mechanical 14:
  lines w0.1: -8.89,-3.81 -6.89,-3.81 -6.89,-0.81 ; -8.89,3.81 -6.89,3.81 -6.89,0.81 ; -6.36,-1.81 -5.36,-1.81 ; -6.36,1.81 -5.36,1.81 ; -5.86,1.31 -5.86,2.31 ; 1.27,-3.81 1.27,-1.81 3.77,-1.81 7.29,-0.878 ; 1.27,3.81 1.27,1.81 3.77,1.81 7.29,0.878 ; 7.19,-1.81 6.79,-1.01 6.39,-1.81 8.89,-1.81 8.89,-3.81 ; 7.19,1.81 6.79,1.01 6.39,1.81 8.89,1.81 8.89,3.81 ; -10,-5.5 -10,5.5 10,5.5 10,-5.5 -10,-5.5 ; -8.39,-0.81 -8.39,0.81 -5.39,0.81 -5.39,-0.81 -8.39,-0.81
3D body "REL_OMRON_G6B-2014P.stp": height 11, standoff -3.5, extent -10,-5.5 10,5.5

## REL_OMRON_G6C-2114P [mm] "6 Leads, Row Spacing 10.16mm; Body L 20mm x W 15mm x H 10mm, OMRON_G6C Series"
height 10
pads (6):
  rect 1.8x1.8 hole 1.1: 1(-8.89,-5.08)
  round 1.8 hole 1.1: 3(1.27,-5.08) 4(8.89,-5.08) 5(8.89,5.08) 6(1.27,5.08) 8(-8.89,5.08)
Top Overlay:
  lines w0.2: -10,-6.2 -10,-7.5 10,-7.5 10,-5.655 ; -10,-3.9 -10,4.505 ; -10,5.655 -10,7.5 10,7.5 10,5.655 ; 10,-4.505 10,4.505 ; -9.5,-0.75 -9.5,0.75 -8.5,0.75 -8.5,-0.75 -9.5,-0.75
Mechanical 8:
  lines w0.1: -9.39,-5.08 -8.89,-5.08 ; -9.39,5.08 -8.89,5.08 ; -8.89,-5.58 -8.89,-5.08 ; -8.89,-4.58 -8.89,-5.08 ; -8.89,4.58 -8.89,5.08 ; -8.89,5.58 -8.89,5.08 ; -8.39,-5.08 -8.89,-5.08 ; -8.39,5.08 -8.89,5.08 ; -0.5,0 0,0 ; 0,-0.5 0,0 ; 0,0.5 0,0 ; 0.5,0 0,0 ; 0.77,-5.08 1.27,-5.08 ; 0.77,5.08 1.27,5.08 ; 1.27,-5.58 1.27,-5.08 ; 1.27,-4.58 1.27,-5.08 ; 1.27,4.58 1.27,5.08 ; 1.27,5.58 1.27,5.08 ; 1.77,-5.08 1.27,-5.08 ; 1.77,5.08 1.27,5.08 ; 8.39,-5.08 8.89,-5.08 ; 8.39,5.08 8.89,5.08 ; 8.89,-5.58 8.89,-5.08 ; 8.89,-4.58 8.89,-5.08 ; 8.89,4.58 8.89,5.08 ; 8.89,5.58 8.89,5.08 ; 9.39,-5.08 8.89,-5.08 ; 9.39,5.08 8.89,5.08
Mechanical 14:
  lines w0.1: -8.89,-5.08 -6.89,-5.08 -6.89,-0.81 ; -8.89,5.08 -6.89,5.08 -6.89,0.81 ; -6.41,-1.71 -5.41,-1.71 ; -6.41,1.91 -5.41,1.91 ; -5.91,1.41 -5.91,2.41 ; 1.27,-5.08 1.27,-3.08 3.77,-3.08 6.803,-1.607 ; 1.27,5.08 1.27,3.08 3.77,3.08 7.29,2.148 ; 7.19,-3.08 6.79,-2.28 6.39,-3.08 8.89,-3.08 8.89,-5.08 ; 7.19,3.08 6.79,2.28 6.39,3.08 8.89,3.08 8.89,5.08 ; -9.5,-0.75 -9.5,0.75 ; -9.5,-0.75 -8.5,-0.75 ; -9.5,-0.75 -9.5,0.75 ; -9.5,-0.75 -8.5,-0.75 ; -9.5,0.75 -8.5,0.75 ; -9.5,0.75 -8.5,0.75 ; -8.5,-0.75 -8.5,0.75 ; -8.5,-0.75 -8.5,0.75 ; -8.39,-0.81 -8.39,0.81 -5.39,0.81 -5.39,-0.81 -8.39,-0.81
3D body "REL_OMRON_G6C-2114P.stp": height 10, standoff -3.6, extent -10,-7.5 10,7.5

## REL_OMRON_G6E-134P [mm] "5 Leads, Row Spacing 7.62mm; Body 16mm x 10mm, OMRON G6E Series"
height 8
pads (5):
  round 1.7 hole 1: 1(-6.35,-3.81) 6(6.35,-3.81) 7(6.35,3.81) 10(-1.27,3.81) 12(-6.35,3.81)
Top Overlay:
  lines w0.2: -8,-5 8,-5 8,5 -8,5 -8,-5 ; -7.7,-1 -6.9,-1 -6.9,1 -7.7,1 -7.7,-1
Mechanical 8:
  lines w0.1: -6.85,-3.81 -6.35,-3.81 ; -6.85,3.81 -6.35,3.81 ; -6.35,-4.31 -6.35,-3.81 ; -6.35,-3.31 -6.35,-3.81 ; -6.35,3.31 -6.35,3.81 ; -6.35,4.31 -6.35,3.81 ; -5.85,-3.81 -6.35,-3.81 ; -5.85,3.81 -6.35,3.81 ; -1.77,3.81 -1.27,3.81 ; -1.27,3.31 -1.27,3.81 ; -1.27,4.31 -1.27,3.81 ; -0.77,3.81 -1.27,3.81 ; -0.5,0 0,0 ; 0,-0.5 0,0 ; 0,0.5 0,0 ; 0.5,0 0,0 ; 5.85,-3.81 6.35,-3.81 ; 5.85,3.81 6.35,3.81 ; 6.35,-4.31 6.35,-3.81 ; 6.35,-3.31 6.35,-3.81 ; 6.35,3.31 6.35,3.81 ; 6.35,4.31 6.35,3.81 ; 6.85,-3.81 6.35,-3.81 ; 6.85,3.81 6.35,3.81
Mechanical 14:
  circle w0.1: c1.73,0.81 r0.2
  lines w0.1: -6.35,-2.66 -6.35,-1.81 -0.5,-1.81 ; -6.35,2.31 -6.35,-0.69 -1.27,-0.69 -1.27,-0.49 ; -5.2,-3.81 -4.7,-3.81 ; -4.7,-4.31 -4.7,-3.81 ; -4.7,-3.31 -4.7,-3.81 ; -4.2,-3.81 -4.7,-3.81 ; -1.772,1.744 1.73,0.81 6.35,0.81 6.35,2.31 ; -1.27,2.11 -1.27,2.31 ; 0.5,-1.81 6.35,-1.81 6.35,-2.66 ; 4.2,-3.81 5.2,-3.81 ; -8,-5 -8,5 8,5 8,-5 -8,-5 ; -7.7,-1 -6.9,-1 -6.9,1 -7.7,1 -7.7,-1 ; -1.559,-0.49 -0.981,-0.49 -1.27,0.01 -1.559,-0.49 ; -1.559,2.11 -0.981,2.11 -1.27,1.61 -1.559,2.11 ; -0.5,-2.81 0.5,-2.81 0.5,-0.81 -0.5,-0.81 -0.5,-2.81
3D body "REL_OMRON_G6E-134P.stp": height 8, standoff -3.5, extent -8,-5 8,5